# Altium schematic symbol library Regulator_Switching.SchLib: 1120 symbols (part 4 of 8) (continued)
## MAX779L
designator *  value MAX779L  Reference: U
ki_keywords: switching regulator boost step-up dc-dc; ki_description: 210mA, Low voltage input, step-up DC-DC converter, adjustable output voltage, DIP-8/SO-8; ki_fp_filters: SOIC*3.9x4.9mm*P1.27mm* DIP*W7.62mm*; Datasheet: https://kanga.gerbilator.org/ICs/MAX777.pdf
pins: 1 ILIM, 2 IN, 3 AGND, 4 PGND, 5 LX, 6 OUT, 7 ~{{SHDN}}, 8 FB

## MAX1771xSA
designator *  value MAX1771xSA  Reference: U
ki_keywords: Adjustable Step-Up Boost Controller; ki_description: 12V or Adjustable, High-Efficiency, Low IQ, Step-Up DC-DC Controller, SO-8; ki_fp_filters: SO*3.9x4.9mm*P1.27mm*; Footprint: Package_SO:SO-8_3.9x4.9mm_P1.27mm; Datasheet: https://datasheets.maximintegrated.com/en/ds/MAX1771.pdf
pins: 1 EXT, 2 V+, 3 FB, 4 SHDN, 5 REF, 6 AGND, 7 GND, 8 CS

## MAX5035AUPA
designator *  value MAX5035AUPA  Reference: U
ki_keywords: 3.3V 1A Step-Down Converter 76V; ki_description: 1A, High-Efficiency Step-Down DC-DC Converter, 3.3V fixed output voltage, Vin 76V, PDIP-8; ki_fp_filters: DIP*W7.62mm*; Footprint: Package_DIP:DIP-8_W7.62mm; Datasheet: http://datasheets.maximintegrated.com/en/ds/MAX5035.pdf
pins: 1 BST, 2 VD, 3 SGND, 4 FB, 5 ON/~{{OFF}}, 6 GND, 7 VIN, 8 LX

## MAX5035AUSA
designator *  value MAX5035AUSA  Reference: U
ki_keywords: 3.3V 1A Step-Down Converter 76V; ki_description: 1A, High-Efficiency Step-Down DC-DC Converter, 3.3V fixed output voltage, Vin 76V, SO-8; ki_fp_filters: SOIC*3.9x4.9mm*P1.27mm*; Footprint: Package_SO:SOIC-8_3.9x4.9mm_P1.27mm; Datasheet: http://datasheets.maximintegrated.com/en/ds/MAX5035.pdf
pins: 1 BST, 2 VD, 3 SGND, 4 FB, 5 ON/~{{OFF}}, 6 GND, 7 VIN, 8 LX

## MAX5035BUPA
designator *  value MAX5035BUPA  Reference: U
ki_keywords: 5V 1A Step-Down Converter 76V; ki_description: 1A, High-Efficiency Step-Down DC-DC Converter, 5V fixed output voltage, Vin 76V, PDIP-8; ki_fp_filters: DIP*W7.62mm*; Footprint: Package_DIP:DIP-8_W7.62mm; Datasheet: http://datasheets.maximintegrated.com/en/ds/MAX5035.pdf
pins: 1 BST, 2 VD, 3 SGND, 4 FB, 5 ON/~{{OFF}}, 6 GND, 7 VIN, 8 LX

## MAX5035BUSA
designator *  value MAX5035BUSA  Reference: U
ki_keywords: 5V 1A Step-Down Converter 76V; ki_description: 1A, High-Efficiency Step-Down DC-DC Converter, 5V fixed output voltage, Vin 76V, SO-8; ki_fp_filters: SOIC*3.9x4.9mm*P1.27mm*; Footprint: Package_SO:SOIC-8_3.9x4.9mm_P1.27mm; Datasheet: http://datasheets.maximintegrated.com/en/ds/MAX5035.pdf
pins: 1 BST, 2 VD, 3 SGND, 4 FB, 5 ON/~{{OFF}}, 6 GND, 7 VIN, 8 LX

## MAX5035CUPA
designator *  value MAX5035CUPA  Reference: U
ki_keywords: 12V 1A Step-Down Converter 76V; ki_description: 1A, High-Efficiency Step-Down DC-DC Converter, 12V fixed output voltage, Vin 76V, PDIP-8; ki_fp_filters: DIP*W7.62mm*; Footprint: Package_DIP:DIP-8_W7.62mm; Datasheet: http://datasheets.maximintegrated.com/en/ds/MAX5035.pdf
pins: 1 BST, 2 VD, 3 SGND, 4 FB, 5 ON/~{{OFF}}, 6 GND, 7 VIN, 8 LX

## MAX5035CUSA
designator *  value MAX5035CUSA  Reference: U
ki_keywords: 12V 1A Step-Down Converter 76V; ki_description: 1A, High-Efficiency Step-Down DC-DC Converter, 12V fixed output voltage, Vin 76V, SO-8; ki_fp_filters: SOIC*3.9x4.9mm*P1.27mm*; Footprint: Package_SO:SOIC-8_3.9x4.9mm_P1.27mm; Datasheet: http://datasheets.maximintegrated.com/en/ds/MAX5035.pdf
pins: 1 BST, 2 VD, 3 SGND, 4 FB, 5 ON/~{{OFF}}, 6 GND, 7 VIN, 8 LX

## MAX5035DUPA
designator *  value MAX5035DUPA  Reference: U
ki_keywords: Adjustable 1A Step-Down Converter 76V; ki_description: 1A, High-Efficiency Step-Down DC-DC Converter, adjustable output voltage, Vin 76V, PDIP-8; ki_fp_filters: DIP*W7.62mm*; Footprint: Package_DIP:DIP-8_W7.62mm; Datasheet: http://datasheets.maximintegrated.com/en/ds/MAX5035.pdf
pins: 1 BST, 2 VD, 3 SGND, 4 FB, 5 ON/~{{OFF}}, 6 GND, 7 VIN, 8 LX

## MAX5035DUSA
designator *  value MAX5035DUSA  Reference: U
ki_keywords: Adjustable 1A Step-Down Converter 76V; ki_description: 1A, High-Efficiency Step-Down DC-DC Converter, adjustable output voltage, Vin 76V, SO-8; ki_fp_filters: SOIC*3.9x4.9mm*P1.27mm*; Footprint: Package_SO:SOIC-8_3.9x4.9mm_P1.27mm; Datasheet: http://datasheets.maximintegrated.com/en/ds/MAX5035.pdf
pins: 1 BST, 2 VD, 3 SGND, 4 FB, 5 ON/~{{OFF}}, 6 GND, 7 VIN, 8 LX

## MAX5035EUSA
designator *  value MAX5035EUSA  Reference: U
ki_keywords: Adjustable 1A Step-Down Converter 76V; ki_description: 1A, High-Efficiency Step-Down DC-DC Converter, adjustable output voltage, Vin 76V, SO-8; ki_fp_filters: SOIC*3.9x4.9mm*P1.27mm*; Footprint: Package_SO:SOIC-8_3.9x4.9mm_P1.27mm; Datasheet: http://datasheets.maximintegrated.com/en/ds/MAX5035.pdf
pins: 1 BST, 2 VD, 3 SGND, 4 FB, 5 ON/~{{OFF}}, 6 GND, 7 VIN, 8 LX

## MAX15062A
designator *  value MAX15062A  Reference: U
ki_keywords: step-down dc-dc switching regulator; ki_description: 60V, 300mA, synchronous step-down dc-dc converter, 3.3V fixed output voltage, DFN-8; ki_fp_filters: DFN*2x2mm*P0.5mm*; Footprint: Package_DFN_QFN:DFN-8_2x2mm_P0.5mm; Datasheet: http://datasheets.maximintegrated.com/en/ds/MAX15062.pdf
pins: 1 VIN, 2 EN/UVLO, 3 VCC, 4 FB/Vout, 5 MODE, 6 ~{{RESET}}, 7 GND, 8 LX

## MAX15062B
designator *  value MAX15062B  Reference: U
ki_keywords: step-down dc-dc switching regulator; ki_description: 60V, 300mA, synchronous step-down dc-dc converter, 5.0V fixed output voltage, DFN-8; ki_fp_filters: DFN*2x2mm*P0.5mm*; Footprint: Package_DFN_QFN:DFN-8_2x2mm_P0.5mm; Datasheet: http://datasheets.maximintegrated.com/en/ds/MAX15062.pdf
pins: 1 VIN, 2 EN/UVLO, 3 VCC, 4 FB/Vout, 5 MODE, 6 ~{{RESET}}, 7 GND, 8 LX

## MAX15062C
designator *  value MAX15062C  Reference: U
ki_keywords: step-down dc-dc switching regulator; ki_description: 60V, 300mA, synchronous step-down dc-dc converter, adjustable output voltage, DFN-8; ki_fp_filters: DFN*2x2mm*P0.5mm*; Footprint: Package_DFN_QFN:DFN-8_2x2mm_P0.5mm; Datasheet: http://datasheets.maximintegrated.com/en/ds/MAX15062.pdf
pins: 1 VIN, 2 EN/UVLO, 3 VCC, 4 FB/Vout, 5 MODE, 6 ~{{RESET}}, 7 GND, 8 LX

## MAX17501AxTB
designator *  value MAX17501AxTB  Reference: U
ki_keywords: Step-down dc-dc switching regulator; ki_description: 4.5V–60Vin, 500mA, High-Efficiency, 3.3V Synchronous Step-Down DC-DC Converter, PFM Mode, TDFN-10; ki_fp_filters: TDFN*1EP*2x3mm*P0.5mm*; Footprint: Package_DFN_QFN:TDFN-10-1EP_2x3mm_P0.5mm_EP0.9x2mm; Datasheet: https://datasheets.maximintegrated.com/en/ds/MAX17501.pdf
pins: 1 PGND, 2 VIN, 3 EN/UVLO, 4 VCC, 5 FB/VO, 6 SS, 7 NC hidden, 8 ~{{RESET}}, 9 GND, 10 LX, 11 GND hidden

## MAX17501BxTB
designator *  value MAX17501BxTB  Reference: U
ki_keywords: Step-down dc-dc switching regulator; ki_description: 4.5V–60Vin, 500mA, High-Efficiency, 5V Synchronous Step-Down DC-DC Converter, PFM Mode, DFN-10; ki_fp_filters: TDFN*1EP*2x3mm*P0.5mm*; Footprint: Package_DFN_QFN:TDFN-10-1EP_2x3mm_P0.5mm_EP0.9x2mm; Datasheet: https://datasheets.maximintegrated.com/en/ds/MAX17501.pdf
pins: 1 PGND, 2 VIN, 3 EN/UVLO, 4 VCC, 5 FB/VO, 6 SS, 7 NC hidden, 8 ~{{RESET}}, 9 GND, 10 LX, 11 GND hidden

## MAX17501ExTB
designator *  value MAX17501ExTB  Reference: U
ki_keywords: Step-down dc-dc switching regulator; ki_description: 4.5V–60Vin, 500mA, High-Efficiency, 3.3V Synchronous Step-Down DC-DC Converter, PWM Mode, DFN-10; ki_fp_filters: TDFN*1EP*2x3mm*P0.5mm*; Footprint: Package_DFN_QFN:TDFN-10-1EP_2x3mm_P0.5mm_EP0.9x2mm; Datasheet: https://datasheets.maximintegrated.com/en/ds/MAX17501.pdf
pins: 1 PGND, 2 VIN, 3 EN/UVLO, 4 VCC, 5 FB/VO, 6 SS, 7 NC hidden, 8 ~{{RESET}}, 9 GND, 10 LX, 11 GND hidden

## MAX17501FxTB
designator *  value MAX17501FxTB  Reference: U
ki_keywords: Step-down dc-dc switching regulator; ki_description: 4.5V–60Vin, 500mA, High-Efficiency, 5V Synchronous Step-Down DC-DC Converter, PWM Mode, DFN-10; ki_fp_filters: TDFN*1EP*2x3mm*P0.5mm*; Footprint: Package_DFN_QFN:TDFN-10-1EP_2x3mm_P0.5mm_EP0.9x2mm; Datasheet: https://datasheets.maximintegrated.com/en/ds/MAX17501.pdf
pins: 1 PGND, 2 VIN, 3 EN/UVLO, 4 VCC, 5 FB/VO, 6 SS, 7 NC hidden, 8 ~{{RESET}}, 9 GND, 10 LX, 11 GND hidden

## MAX17501GxTB
designator *  value MAX17501GxTB  Reference: U
ki_keywords: Step-down dc-dc switching regulator; ki_description: 4.5V–60Vin, 500mA, High-Efficiency, Adjustable Synchronous Step-Down DC-DC Converter, 600KHz, TDFN-10; ki_fp_filters: TDFN*1EP*2x3mm*P0.5mm*; Footprint: Package_DFN_QFN:TDFN-10-1EP_2x3mm_P0.5mm_EP0.9x2mm; Datasheet: https://datasheets.maximintegrated.com/en/ds/MAX17501.pdf
pins: 1 PGND, 2 VIN, 3 EN/UVLO, 4 VCC, 5 FB/VO, 6 SS, 7 COMP, 8 ~{{RESET}}, 9 GND, 10 LX, 11 GND hidden

## MAX17501HxTB
designator *  value MAX17501HxTB  Reference: U
ki_keywords: Step-down dc-dc switching regulator; ki_description: 4.5V–60Vin, 500mA, High-Efficiency, Adjustable Synchronous Step-Down DC-DC Converter, 300KHz, DFN-10; ki_fp_filters: TDFN*1EP*2x3mm*P0.5mm*; Footprint: Package_DFN_QFN:TDFN-10-1EP_2x3mm_P0.5mm_EP0.9x2mm; Datasheet: https://datasheets.maximintegrated.com/en/ds/MAX17501.pdf
pins: 1 PGND, 2 VIN, 3 EN/UVLO, 4 VCC, 5 FB/VO, 6 SS, 7 COMP, 8 ~{{RESET}}, 9 GND, 10 LX, 11 GND hidden

## MAX17572
designator *  value MAX17572  Reference: U
ki_keywords: Step-down dc-dc switching regulator; ki_description: 4.5V–60V, 1A, High-Efficiency, Synchronous Step-Down DC-DC Converter with Internal Compensation, DFN-12; ki_fp_filters: DFN*1EP*3x3mm*P0.5mm*; Footprint: Package_DFN_QFN:DFN-12-1EP_3x3mm_P0.5mm_EP2.05x2.86mm; Datasheet: https://datasheets.maximintegrated.com/en/ds/MAX17572.pdf
pins: 1 VIN, 2 EN/UVLO, 3 ~{{RESET}}, 4 SS, 5 VCC, 6 RT/SYNC, 7 FB, 8 GND, 9 EXTVCC, 10 BST, 11 LX, 12 PGND, 13 EP

## MAX17574
designator *  value MAX17574  Reference: U
ki_keywords: Step-down dc-dc switching regulator; ki_description: 4.5V–60V, 3A, High-Efficiency, Synchronous Step-Down DC-DC Converter with Internal Compensation, QFN-24; ki_fp_filters: QFN*1EP*4x5mm*P0.5mm*; Footprint: Package_DFN_QFN:QFN-24-1EP_4x5mm_P0.5mm_EP2.65x3.65mm; Datasheet: https://datasheets.maximintegrated.com/en/ds/MAX17574.pdf
pins: 1 LX hidden, 2 PGND, 3 PGND hidden, 4 NC hidden, 5 VIN hidden, 6 VIN hidden, 7 VIN hidden, 8 NC hidden, 9 VIN, 10 EN/UVLO, 11 PGND hidden, 12 VCC, 13 NC hidden, 14 ~{{RESET}}, 15 MODE/SYNC, 16 SS, 17 CF, 18 FB, 19 RT, 20 EXTVCC, 21 SGND, 22 BST, 23 LX hidden, 24 LX, 25 EP

## MAX17620ATA
designator *  value MAX17620ATA  Reference: U
ki_keywords: switching-regulator; ki_description: 2.7-5.5V, 600mA, Synchronous Step-Down DC-DC Converter with Integrated MOSFETs, DFN-8; ki_fp_filters: TDFN*1EP*2x2mm*P0.5mm*; Footprint: Package_DFN_QFN:TDFN-8-1EP_2x2mm_P0.5mm_EP0.8x1.2mm; Datasheet: https://datasheets.maximintegrated.com/en/ds/MAX17620.pdf
pins: 1 IN, 2 GND, 3 EN, 4 MODE, 5 PGOOD, 6 FB, 7 VOUT, 8 LX, 9 GND hidden

## MC33063AD
designator *  value MC33063AD  Reference: U
ki_keywords: smps buck boost inverting; ki_description: 1.5A, step-up/down/inverting switching regulator, 3-40V Vin, 100kHz, SO-8; ki_fp_filters: SOIC*3.9x4.9mm*P1.27mm*; Footprint: Package_SO:SOIC-8_3.9x4.9mm_P1.27mm; Datasheet: http://www.onsemi.com/pub_link/Collateral/MC34063A-D.PDF
pins: 1 SwC, 2 SwE, 3 TC, 4 GND, 5 Vfb, 6 Vin, 7 Ipk, 8 DC

## MC33063AP
designator *  value MC33063AP  Reference: U
ki_keywords: smps buck boost inverting; ki_description: 1.5A, step-up/down/inverting switching regulator, 3-40V Vin, 100kHz, DIP-8; ki_fp_filters: DIP*W7.62mm*; Footprint: Package_DIP:DIP-8_W7.62mm; Datasheet: http://www.onsemi.com/pub_link/Collateral/MC34063A-D.PDF
pins: 1 SwC, 2 SwE, 3 TC, 4 GND, 5 Vfb, 6 Vin, 7 Ipk, 8 DC

## MC33063MNTXG
designator *  value MC33063MNTXG  Reference: U
ki_keywords: smps buck boost inverting; ki_description: 1.5A, step-up/down/inverting switching regulator, 3-40V Vin, 100kHz, DFN-8; ki_fp_filters: DFN*EP*4x4mm*P0.8mm*; Footprint: Package_DFN_QFN:DFN-8-1EP_4x4mm_P0.8mm_EP2.5x3.6mm; Datasheet: http://www.onsemi.com/pub_link/Collateral/MC34063A-D.PDF
pins: 1 SwC, 2 SwE, 3 TC, 4 GND, 5 Vfb, 6 Vin, 7 Ipk, 8 DC, 9 PAD

## MC34063AD
designator *  value MC34063AD  Reference: U
ki_keywords: smps buck boost inverting; ki_description: 1.5A, step-up/down/inverting switching regulator, 3-40V Vin, 100kHz, SO-8; ki_fp_filters: SOIC*3.9x4.9mm*P1.27mm*; Footprint: Package_SO:SOIC-8_3.9x4.9mm_P1.27mm; Datasheet: http://www.onsemi.com/pub_link/Collateral/MC34063A-D.PDF
pins: 1 SwC, 2 SwE, 3 TC, 4 GND, 5 Vfb, 6 Vin, 7 Ipk, 8 DC

## MC34063AP
designator *  value MC34063AP  Reference: U
ki_keywords: smps buck boost inverting; ki_description: 1.5A, step-up/down/inverting switching regulator, 3-40V Vin, 100kHz, DIP-8; ki_fp_filters: DIP*W7.62mm*; Footprint: Package_DIP:DIP-8_W7.62mm; Datasheet: http://www.onsemi.com/pub_link/Collateral/MC34063A-D.PDF
pins: 1 SwC, 2 SwE, 3 TC, 4 GND, 5 Vfb, 6 Vin, 7 Ipk, 8 DC

## MCP1640BCH
designator *  value MCP1640BCH  Reference: U
ki_keywords: Step-Up Boost DC-DC Regulator Adjustable; ki_description: Synchronous Boost Regulator, Adjustable Output 2.0V-5.5V, PWM Only True Disconnect, SOT-23; ki_fp_filters: SOT?23*; Footprint: Package_TO_SOT_SMD:SOT-23-6; Datasheet: http://ww1.microchip.com/downloads/en/DeviceDoc/20002234D.pdf
pins: 1 SW, 2 GND, 3 EN, 4 VFB, 5 VOUT, 6 VIN

## MCP1640BMC
designator *  value MCP1640BMC  Reference: U
ki_keywords: Step-Up Boost DC-DC Regulator Adjustable; ki_description: Synchronous Boost Regulator, Adjustable Output 2.0V-5.5V, PWM Only True Disconnect, DFN-8; ki_fp_filters: DFN*1EP*3x2mm*P0.5mm*; Footprint: Package_DFN_QFN:DFN-8-1EP_3x2mm_P0.5mm_EP1.75x1.45mm; Datasheet: http://ww1.microchip.com/downloads/en/DeviceDoc/20002234D.pdf
pins: 1 VFB, 2 SGND, 3 PGND, 4 EN, 5 SW, 6 VOUTP, 7 VOUTS, 8 VIN, 9 PAD

## MCP1640CCH
designator *  value MCP1640CCH  Reference: U
ki_keywords: Step-Up Boost DC-DC Regulator Adjustable; ki_description: Synchronous Boost Regulator, Adjustable Output 2.0V-5.5V, PWM/PFM Input to Output Bypass, SOT-23; ki_fp_filters: SOT?23*; Footprint: Package_TO_SOT_SMD:SOT-23-6; Datasheet: http://ww1.microchip.com/downloads/en/DeviceDoc/20002234D.pdf
pins: 1 SW, 2 GND, 3 EN, 4 VFB, 5 VOUT, 6 VIN

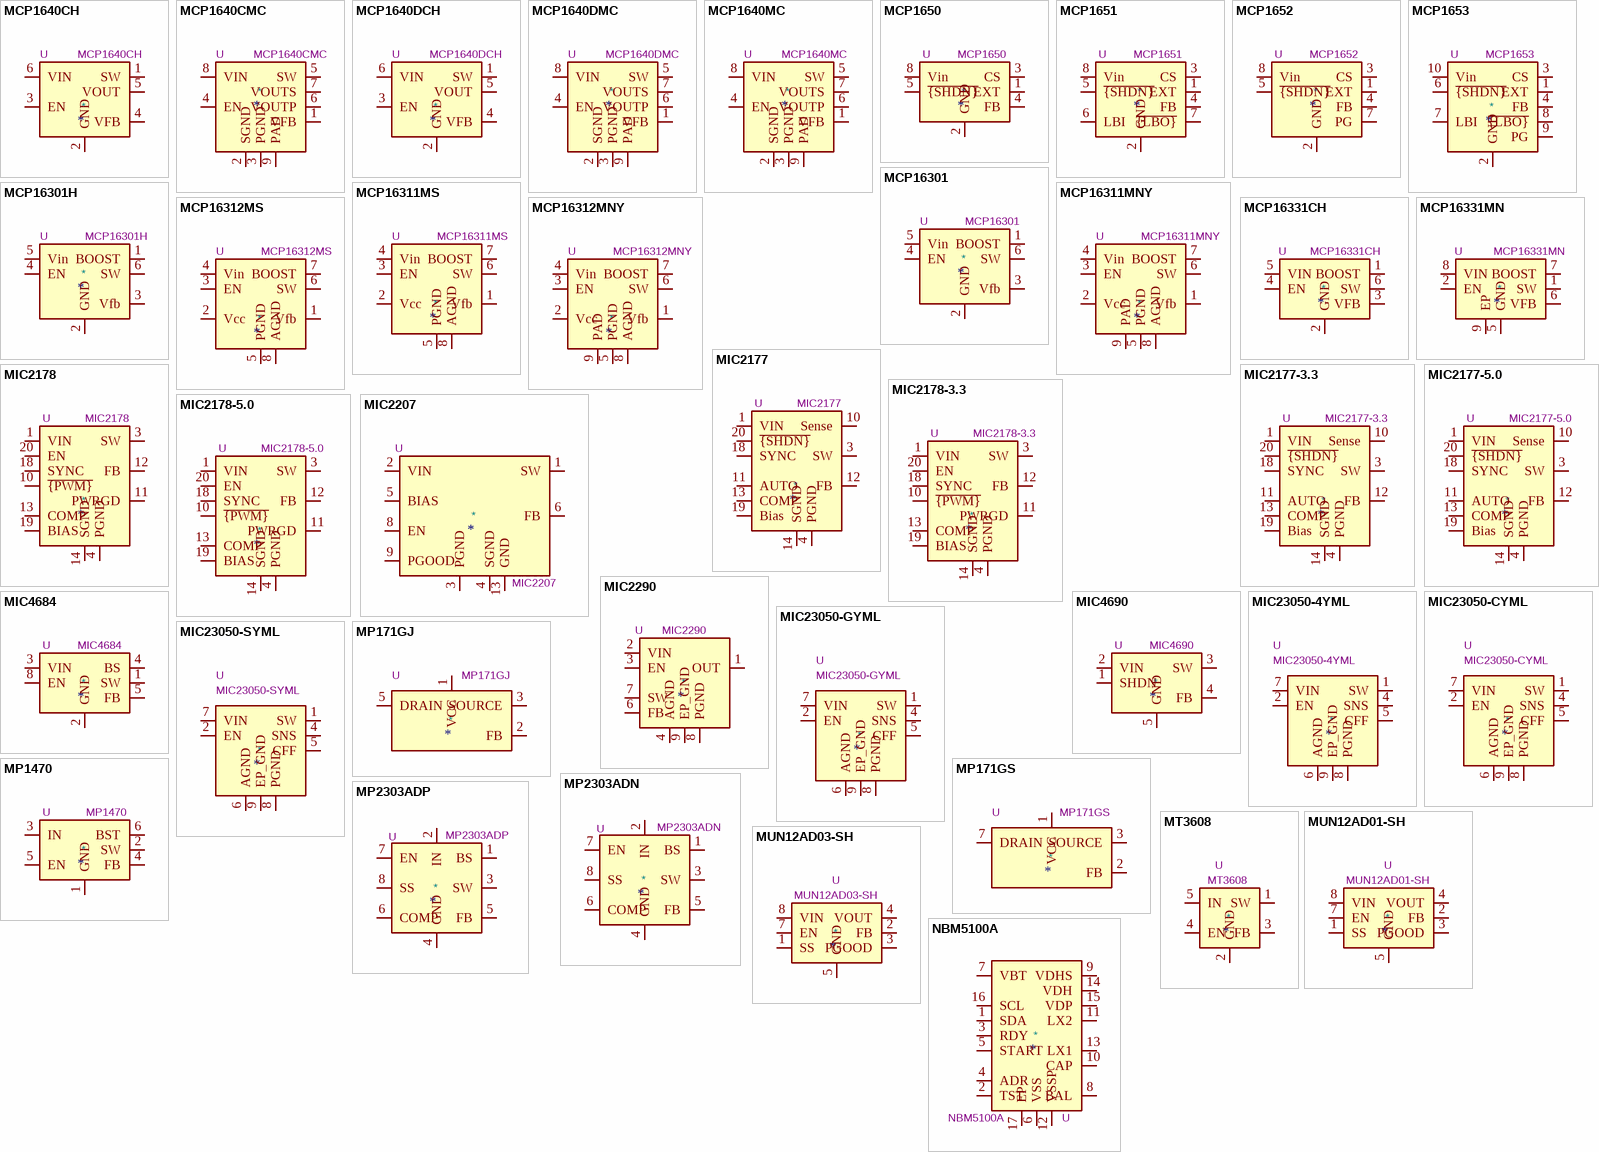
[diagram p14: symbols MCP1640CH to NBM5100A]

## MCP1640CH
designator *  value MCP1640CH  Reference: U
ki_keywords: Step-Up Boost DC-DC Regulator Adjustable; ki_description: Synchronous Boost Regulator, Adjustable Output 2.0V-5.5V, PWM/PFM True Disconnect, SOT-23; ki_fp_filters: SOT?23*; Footprint: Package_TO_SOT_SMD:SOT-23-6; Datasheet: http://ww1.microchip.com/downloads/en/DeviceDoc/20002234D.pdf
pins: 1 SW, 2 GND, 3 EN, 4 VFB, 5 VOUT, 6 VIN

## MCP1640CMC
designator *  value MCP1640CMC  Reference: U
ki_keywords: Step-Up Boost DC-DC Regulator Adjustable; ki_description: Synchronous Boost Regulator, Adjustable Output 2.0V-5.5V, PWM/PFM Input to Output Bypass, DFN-8; ki_fp_filters: DFN*1EP*3x2mm*P0.5mm*; Footprint: Package_DFN_QFN:DFN-8-1EP_3x2mm_P0.5mm_EP1.75x1.45mm; Datasheet: http://ww1.microchip.com/downloads/en/DeviceDoc/20002234D.pdf
pins: 1 VFB, 2 SGND, 3 PGND, 4 EN, 5 SW, 6 VOUTP, 7 VOUTS, 8 VIN, 9 PAD

## MCP1640DCH
designator *  value MCP1640DCH  Reference: U
ki_keywords: Step-Up Boost DC-DC Regulator Adjustable; ki_description: Synchronous Boost Regulator, Adjustable Output 2.0V-5.5V, PWM Only Input to Output Bypass, SOT-23; ki_fp_filters: SOT?23*; Footprint: Package_TO_SOT_SMD:SOT-23-6; Datasheet: http://ww1.microchip.com/downloads/en/DeviceDoc/20002234D.pdf
pins: 1 SW, 2 GND, 3 EN, 4 VFB, 5 VOUT, 6 VIN

## MCP1640DMC
designator *  value MCP1640DMC  Reference: U
ki_keywords: Step-Up Boost DC-DC Regulator Adjustable; ki_description: Synchronous Boost Regulator, Adjustable Output 2.0V-5.5V, PWM Only Input to Output Bypass, DFN-8; ki_fp_filters: DFN*1EP*3x2mm*P0.5mm*; Footprint: Package_DFN_QFN:DFN-8-1EP_3x2mm_P0.5mm_EP1.75x1.45mm; Datasheet: http://ww1.microchip.com/downloads/en/DeviceDoc/20002234D.pdf
pins: 1 VFB, 2 SGND, 3 PGND, 4 EN, 5 SW, 6 VOUTP, 7 VOUTS, 8 VIN, 9 PAD

## MCP1640MC
designator *  value MCP1640MC  Reference: U
ki_keywords: Step-Up Boost DC-DC Regulator Adjustable; ki_description: Synchronous Boost Regulator, Adjustable Output 2.0V-5.5V, PWM/PFM True Disconnect, DFN-8; ki_fp_filters: DFN*1EP*3x2mm*P0.5mm*; Footprint: Package_DFN_QFN:DFN-8-1EP_3x2mm_P0.5mm_EP1.75x1.45mm; Datasheet: http://ww1.microchip.com/downloads/en/DeviceDoc/20002234D.pdf
pins: 1 VFB, 2 SGND, 3 PGND, 4 EN, 5 SW, 6 VOUTP, 7 VOUTS, 8 VIN, 9 PAD

## MCP1650
designator *  value MCP1650  Reference: U
ki_keywords: boost controller; ki_description: 750 kHz Boost Controller, 3.3-100V output voltage, 5W, MSOP-8; ki_fp_filters: MSOP*3x3mm*P0.65mm*; Footprint: Package_SO:MSOP-8_3x3mm_P0.65mm; Datasheet: http://ww1.microchip.com/downloads/en/DeviceDoc/21876B.pdf
pins: 1 EXT, 2 GND, 3 CS, 4 FB, 5 ~{{SHDN}}, 6 NC hidden, 7 NC hidden, 8 Vin

## MCP1651
designator *  value MCP1651  Reference: U
ki_keywords: boost controller; ki_description: 750 kHz Boost Controller, 3.3-100V output voltage, 5W, Low Battery Detection, MSOP-8; ki_fp_filters: MSOP*3x3mm*P0.65mm*; Footprint: Package_SO:MSOP-8_3x3mm_P0.65mm; Datasheet: http://ww1.microchip.com/downloads/en/DeviceDoc/21876B.pdf
pins: 1 EXT, 2 GND, 3 CS, 4 FB, 5 ~{{SHDN}}, 6 LBI, 7 ~{{LBO}}, 8 Vin

## MCP1652
designator *  value MCP1652  Reference: U
ki_keywords: boost controller; ki_description: 750 kHz Boost Controller, 3.3-100V output voltage, 5W, Power Good Detection, MSOP-8; ki_fp_filters: MSOP*3x3mm*P0.65mm*; Footprint: Package_SO:MSOP-8_3x3mm_P0.65mm; Datasheet: http://ww1.microchip.com/downloads/en/DeviceDoc/21876B.pdf
pins: 1 EXT, 2 GND, 3 CS, 4 FB, 5 ~{{SHDN}}, 6 NC hidden, 7 PG, 8 Vin

## MCP1653
designator *  value MCP1653  Reference: U
ki_keywords: boost controller; ki_description: 750 kHz Boost Controller, 3.3-100V output voltage, 5W, Low Battery Detection, Power Good Detection, MSOP-10; ki_fp_filters: MSOP*3x3mm*P0.5mm*; Footprint: Package_SO:MSOP-10_3x3mm_P0.5mm; Datasheet: http://ww1.microchip.com/downloads/en/DeviceDoc/21876B.pdf
pins: 1 EXT, 2 GND, 3 CS, 4 FB, 5 NC hidden, 6 ~{{SHDN}}, 7 LBI, 8 ~{{LBO}}, 9 PG, 10 Vin

## MCP16301
designator *  value MCP16301  Reference: U
ki_keywords: switching buck converter power-supply voltage regulator; ki_description: 1A, 4.0 to 30V Input, High Voltage Input integrated switch step-down regulator, SOT-23-6; ki_fp_filters: SOT?23*; Footprint: Package_TO_SOT_SMD:SOT-23-6; Datasheet: http://ww1.microchip.com/downloads/en/DeviceDoc/20005004D.pdf
pins: 1 BOOST, 2 GND, 3 Vfb, 4 EN, 5 Vin, 6 SW

## MCP16301H
designator *  value MCP16301H  Reference: U
ki_keywords: switching buck converter power-supply voltage regulator; ki_description: 1A, 4.7 to 36V Input, High Voltage Input integrated switch step-down regulator, SOT-23-6; ki_fp_filters: SOT?23*; Footprint: Package_TO_SOT_SMD:SOT-23-6; Datasheet: http://ww1.microchip.com/downloads/en/DeviceDoc/20005004D.pdf
pins: 1 BOOST, 2 GND, 3 Vfb, 4 EN, 5 Vin, 6 SW

## MCP16311MNY
designator *  value MCP16311MNY  Reference: U
ki_keywords: switching buck converter power-supply voltage regulator; ki_description: 1A Output Voltage, 30V Input, integrated switch step-down regulator, PFM/PWM modulation, DFN-8; ki_fp_filters: DFN*1EP*3x2mm*P0.5mm*; Footprint: Package_DFN_QFN:DFN-8-1EP_3x2mm_P0.5mm_EP1.75x1.45mm; Datasheet: http://ww1.microchip.com/downloads/en/DeviceDoc/20005255B.pdf
pins: 1 Vfb, 2 Vcc, 3 EN, 4 Vin, 5 PGND, 6 SW, 7 BOOST, 8 AGND, 9 PAD

## MCP16311MS
designator *  value MCP16311MS  Reference: U
ki_keywords: switching buck converter power-supply voltage regulator; ki_description: 30V Input, 1A Output Voltage, integrated switch step-down regulator, PFM/PWM modulation, MSOP-8; ki_fp_filters: MSOP*3x3mm*P0.65mm*; Footprint: Package_SO:MSOP-8_3x3mm_P0.65mm; Datasheet: http://ww1.microchip.com/downloads/en/DeviceDoc/20005255B.pdf
pins: 1 Vfb, 2 Vcc, 3 EN, 4 Vin, 5 PGND, 6 SW, 7 BOOST, 8 AGND

## MCP16312MNY
designator *  value MCP16312MNY  Reference: U
ki_keywords: switching buck converter power-supply voltage regulator; ki_description: 1A Output Voltage, 30V Input, integrated switch step-down regulator, PWM modulation, DFN-8; ki_fp_filters: DFN*1EP*3x2mm*P0.5mm*; Footprint: Package_DFN_QFN:DFN-8-1EP_3x2mm_P0.5mm_EP1.75x1.45mm; Datasheet: http://ww1.microchip.com/downloads/en/DeviceDoc/20005255B.pdf
pins: 1 Vfb, 2 Vcc, 3 EN, 4 Vin, 5 PGND, 6 SW, 7 BOOST, 8 AGND, 9 PAD

## MCP16312MS
designator *  value MCP16312MS  Reference: U
ki_keywords: switching buck converter power-supply voltage regulator; ki_description: 1A Output Voltage, 30V Input, integrated switch step-down regulator with, modulation, MSOP-8; ki_fp_filters: MSOP*3x3mm*P0.65mm*; Footprint: Package_SO:MSOP-8_3x3mm_P0.65mm; Datasheet: http://ww1.microchip.com/downloads/en/DeviceDoc/20005255B.pdf
pins: 1 Vfb, 2 Vcc, 3 EN, 4 Vin, 5 PGND, 6 SW, 7 BOOST, 8 AGND

## MCP16331CH
designator *  value MCP16331CH  Reference: U
ki_keywords: High-Voltage Input Integrated Switch Step-Down Regulator; ki_description: High-Voltage Input Integrated Switch Step-Down Regulator, VDD +4.4V to 50V, Out +2.0V to +24V, SOT-23; ki_fp_filters: SOT?23*; Footprint: Package_TO_SOT_SMD:SOT-23-6; Datasheet: http://ww1.microchip.com/downloads/en/DeviceDoc/20005308C.pdf
pins: 1 BOOST, 2 GND, 3 VFB, 4 EN, 5 VIN, 6 SW

## MCP16331MN
designator *  value MCP16331MN  Reference: U
ki_keywords: High-Voltage Input Integrated Switch Step-Down Regulator; ki_description: High-Voltage Input Integrated Switch Step-Down Regulator, VDD +4.4V to 50V, Out +2.0V to +24V, TDFN-8; ki_fp_filters: DFN*1EP*3x2mm*P0.5mm*; Footprint: Package_DFN_QFN:DFN-8-1EP_3x2mm_P0.5mm_EP1.75x1.45mm; Datasheet: http://ww1.microchip.com/downloads/en/DeviceDoc/20005308C.pdf
pins: 1 SW, 2 EN, 3 NC hidden, 4 NC hidden, 5 GND, 6 VFB, 7 BOOST, 8 VIN, 9 EP

## MIC2177
designator *  value MIC2177  Reference: U
ki_keywords: Synchronous Buck Regulator adjustable; ki_description: 2.5A Synchronous Buck Regulator, Adjustable Output Voltage, SO-20W; ki_fp_filters: SOIC*W?7.5x12.8mm?P1.27mm*; Footprint: Package_SO:SOIC-20W_7.5x12.8mm_P1.27mm; Datasheet: http://ww1.microchip.com/downloads/en/DeviceDoc/mic2177.pdf
pins: 1 VIN, 2 VIN hidden, 3 SW, 4 PGND, 5 PGND hidden, 6 PGND hidden, 7 PGND hidden, 8 SW hidden, 9 VIN hidden, 10 Sense, 11 AUTO, 12 FB, 13 COMP, 14 SGND, 15 SGND hidden, 16 SGND hidden, 17 SGND hidden, 18 SYNC, 19 Bias, 20 ~{{SHDN}}

## MIC2177-3.3
designator *  value MIC2177-3.3  Reference: U
ki_keywords: Synchronous Buck Regulator fixed; ki_description: 2.5A Synchronous Buck Regulator, 3.3V Fixed Output Voltage, SO-20W; ki_fp_filters: SOIC*W?7.5x12.8mm?P1.27mm*; Footprint: Package_SO:SOIC-20W_7.5x12.8mm_P1.27mm; Datasheet: http://ww1.microchip.com/downloads/en/DeviceDoc/mic2177.pdf
pins: 1 VIN, 2 VIN hidden, 3 SW, 4 PGND, 5 PGND hidden, 6 PGND hidden, 7 PGND hidden, 8 SW hidden, 9 VIN hidden, 10 Sense, 11 AUTO, 12 FB, 13 COMP, 14 SGND, 15 SGND hidden, 16 SGND hidden, 17 SGND hidden, 18 SYNC, 19 Bias, 20 ~{{SHDN}}

## MIC2177-5.0
designator *  value MIC2177-5.0  Reference: U
ki_keywords: Synchronous Buck Regulator fixed; ki_description: 2.5A Synchronous Buck Regulator, 5.0V Fixed Output Voltage, SO-20W; ki_fp_filters: SOIC*W?7.5x12.8mm?P1.27mm*; Footprint: Package_SO:SOIC-20W_7.5x12.8mm_P1.27mm; Datasheet: http://ww1.microchip.com/downloads/en/DeviceDoc/mic2177.pdf
pins: 1 VIN, 2 VIN hidden, 3 SW, 4 PGND, 5 PGND hidden, 6 PGND hidden, 7 PGND hidden, 8 SW hidden, 9 VIN hidden, 10 Sense, 11 AUTO, 12 FB, 13 COMP, 14 SGND, 15 SGND hidden, 16 SGND hidden, 17 SGND hidden, 18 SYNC, 19 Bias, 20 ~{{SHDN}}

## MIC2178
designator *  value MIC2178  Reference: U
ki_keywords: Synchronous Buck Regulator adjustable; ki_description: 2.5A Synchronous Buck Regulator, 4.5-16.5V Input Voltage, Adjustable Output Voltage, SO-20W; ki_fp_filters: SOIC*W*7.5x12.8mm*P1.27mm*; Footprint: Package_SO:SOIC-20W_7.5x12.8mm_P1.27mm; Datasheet: http://ww1.microchip.com/downloads/en/DeviceDoc/mic2177.pdf
pins: 1 VIN, 2 VIN hidden, 3 SW, 4 PGND, 5 PGND hidden, 6 PGND hidden, 7 PGND hidden, 8 SW hidden, 9 VIN hidden, 10 ~{{PWM}}, 11 PWRGD, 12 FB, 13 COMP, 14 SGND, 15 SGND hidden, 16 SGND hidden, 17 SGND hidden, 18 SYNC, 19 BIAS, 20 EN

## MIC2178-3.3
designator *  value MIC2178-3.3  Reference: U
ki_keywords: Synchronous Buck Regulator fixed; ki_description: 2.5A Synchronous Buck Regulator, 4.5-16.5V Input Voltage, 3.3V Fixed Output Voltage, SO-20W; ki_fp_filters: SOIC*W*7.5x12.8mm*P1.27mm*; Footprint: Package_SO:SOIC-20W_7.5x12.8mm_P1.27mm; Datasheet: http://ww1.microchip.com/downloads/en/DeviceDoc/mic2177.pdf
pins: 1 VIN, 2 VIN hidden, 3 SW, 4 PGND, 5 PGND hidden, 6 PGND hidden, 7 PGND hidden, 8 SW hidden, 9 VIN hidden, 10 ~{{PWM}}, 11 PWRGD, 12 FB, 13 COMP, 14 SGND, 15 SGND hidden, 16 SGND hidden, 17 SGND hidden, 18 SYNC, 19 BIAS, 20 EN

## MIC2178-5.0
designator *  value MIC2178-5.0  Reference: U
ki_keywords: Synchronous Buck Regulator fixed; ki_description: 2.5A Synchronous Buck Regulator, 4.5-16.5V Input Voltage, 5.0V Fixed Output Voltage, SO-20W; ki_fp_filters: SOIC*W*7.5x12.8mm*P1.27mm*; Footprint: Package_SO:SOIC-20W_7.5x12.8mm_P1.27mm; Datasheet: http://ww1.microchip.com/downloads/en/DeviceDoc/mic2177.pdf
pins: 1 VIN, 2 VIN hidden, 3 SW, 4 PGND, 5 PGND hidden, 6 PGND hidden, 7 PGND hidden, 8 SW hidden, 9 VIN hidden, 10 ~{{PWM}}, 11 PWRGD, 12 FB, 13 COMP, 14 SGND, 15 SGND hidden, 16 SGND hidden, 17 SGND hidden, 18 SYNC, 19 BIAS, 20 EN

## MIC2207
designator *  value MIC2207  Reference: U
ki_keywords: adjustable switching regulator; ki_description: 3A 2MHz Non-Synchronous Buck Regulator, DFN-12; ki_fp_filters: DFN*1EP*3x3mm*P0.5mm*; Footprint: Package_DFN_QFN:DFN-12-1EP_3x3mm_P0.5mm_EP1.7x2.4mm; Datasheet: https://ww1.microchip.com/downloads/aemDocuments/documents/APID/ProductDocuments/DataSheets/MIC2207-2MHz-3A-PWM-Buck-Regulator-DS20006470A.pdf
pins: 1 SW, 2 VIN, 3 PGND, 4 SGND, 5 BIAS, 6 FB, 7 NC hidden, 8 EN, 9 PGOOD, 10 PGND hidden, 11 VIN hidden, 12 SW hidden, 13 GND

## MIC2290
designator *  value MIC2290  Reference: U
ki_keywords: boost switching voltage converter regulator; ki_description: 1.2 Mhz PWM Boost Regulator with Internal Schotty Diode, MLF-8; ki_fp_filters: Micrel*MLF*8*2x2mm*; Footprint: Package_DFN_QFN:Micrel_MLF-8-1EP_2x2mm_P0.5mm_EP0.8x1.3mm_ThermalVias; Datasheet: http://ww1.microchip.com/downloads/en/DeviceDoc/mic2290.pdf
pins: 1 OUT, 2 VIN, 3 EN, 4 AGND, 5 NC hidden, 6 FB, 7 SW, 8 PGND, 9 EP_GND

## MIC4684
designator *  value MIC4684  Reference: U
ki_keywords: regulator switching adjustable; ki_description: 2A, 200kHz SuperSwitcher Buck Regulator, 4-30V Input Voltage, Adjustable Output Voltage, SO-8; ki_fp_filters: SOIC*3.9x4.9mm*P1.27mm*; Footprint: Package_SO:SOIC-8_3.9x4.9mm_P1.27mm; Datasheet: https://ww1.microchip.com/downloads/en/DeviceDoc/MIC4684.pdf
pins: 1 SW, 2 GND, 3 VIN, 4 BS, 5 FB, 6 GND hidden, 7 GND hidden, 8 EN

## MIC4690
designator *  value MIC4690  Reference: U
ki_keywords: regulator switching adjustable; ki_description: 1A, 500kHz SuperSwitcher Buck Regulator, 4-34V Input Voltage, Adjustable Output Voltage, SO-8; ki_fp_filters: SOIC*3.9x4.9mm*P1.27mm*; Footprint: Package_SO:SOIC-8_3.9x4.9mm_P1.27mm; Datasheet: http://ww1.microchip.com/downloads/en/DeviceDoc/mic4690.pdf
pins: 1 SHDN, 2 VIN, 3 SW, 4 FB, 5 GND, 6 GND hidden, 7 GND hidden, 8 GND hidden

## MIC23050-4YML
designator *  value MIC23050-4YML  Reference: U
ki_keywords: regulator switching; ki_description: 4MHz PWM Buck Regulator with HyperLight Load Switching Scheme, 1.2V Fixed Output Voltage; ki_fp_filters: Micrel*MLF*8*2x2mm*; Footprint: Package_DFN_QFN:Micrel_MLF-8-1EP_2x2mm_P0.5mm_EP0.6x1.2mm_ThermalVias; Datasheet: http://ww1.microchip.com/downloads/en/DeviceDoc/mic23050.pdf
pins: 1 SW, 2 EN, 3 NC hidden, 4 SNS, 5 CFF, 6 AGND, 7 VIN, 8 PGND, 9 EP_GND

## MIC23050-CYML
designator *  value MIC23050-CYML  Reference: U
ki_keywords: regulator switching; ki_description: 4MHz PWM Buck Regulator with HyperLight Load Switching Scheme, 1.0V Fixed Output Voltage, MLF-8; ki_fp_filters: Micrel*MLF*8*2x2mm*; Footprint: Package_DFN_QFN:Micrel_MLF-8-1EP_2x2mm_P0.5mm_EP0.6x1.2mm_ThermalVias; Datasheet: http://ww1.microchip.com/downloads/en/DeviceDoc/mic23050.pdf
pins: 1 SW, 2 EN, 3 NC hidden, 4 SNS, 5 CFF, 6 AGND, 7 VIN, 8 PGND, 9 EP_GND

## MIC23050-GYML
designator *  value MIC23050-GYML  Reference: U
ki_keywords: regulator switching; ki_description: 4MHz PWM Buck Regulator with HyperLight Load Switching Scheme, 1.8V Fixed Output Voltage; ki_fp_filters: Micrel*MLF*8*2x2mm*; Footprint: Package_DFN_QFN:Micrel_MLF-8-1EP_2x2mm_P0.5mm_EP0.6x1.2mm_ThermalVias; Datasheet: http://ww1.microchip.com/downloads/en/DeviceDoc/mic23050.pdf
pins: 1 SW, 2 EN, 3 NC hidden, 4 SNS, 5 CFF, 6 AGND, 7 VIN, 8 PGND, 9 EP_GND

## MIC23050-SYML
designator *  value MIC23050-SYML  Reference: U
ki_keywords: regulator switching; ki_description: 4MHz PWM Buck Regulator with HyperLight Load Switching Scheme, 3.3V Fixed Output Voltage; ki_fp_filters: Micrel*MLF*8*2x2mm*; Footprint: Package_DFN_QFN:Micrel_MLF-8-1EP_2x2mm_P0.5mm_EP0.6x1.2mm_ThermalVias; Datasheet: http://ww1.microchip.com/downloads/en/DeviceDoc/mic23050.pdf
pins: 1 SW, 2 EN, 3 NC hidden, 4 SNS, 5 CFF, 6 AGND, 7 VIN, 8 PGND, 9 EP_GND

## MP171GJ
designator *  value MP171GJ  Reference: U
ki_keywords: regulator switching adjustable; ki_description: 60mA Non-Isolated Off-Line Regulator, 700V Input Voltage, Adjustable Output Voltage, TSOT-23-5; ki_fp_filters: TSOT?23*; Footprint: Package_TO_SOT_SMD:TSOT-23-5; Datasheet: https://www.monolithicpower.com/pub/media/document/m/p/mp171_r1.01.pdf
pins: 1 VCC, 2 FB, 3 SOURCE, 4 SOURCE hidden, 5 DRAIN

## MP171GS
designator *  value MP171GS  Reference: U
ki_keywords: regulator switching adjustable; ki_description: 60mA Non-Isolated Off-Line Regulator, 700V Input Voltage, Adjustable Output Voltage, SOIC-8; ki_fp_filters: SOIC*3.9x4.9mm*P1.27mm*; Footprint: Package_SO:SOIC-8_3.9x4.9mm_P1.27mm; Datasheet: https://www.monolithicpower.com/pub/media/document/m/p/mp171_r1.01.pdf
pins: 1 VCC, 2 FB, 3 SOURCE, 4 SOURCE hidden, 5 NC hidden, 6 NC hidden, 7 DRAIN, 8 NC hidden

## MP1470
designator *  value MP1470  Reference: U
ki_keywords: buck converter; ki_description: High-Efficiency, 2A, 16V, 500kHz Synchronous, Step-Down Converter, TSOT-23-6; ki_fp_filters: TSOT?23*; Footprint: Package_TO_SOT_SMD:TSOT-23-6; Datasheet: https://www.monolithicpower.com/pub/media/document/MP1470_r1.02.pdf
pins: 1 GND, 2 SW, 3 IN, 4 FB, 5 EN, 6 BST

## MP2303ADN
designator *  value MP2303ADN  Reference: U
ki_keywords: buck converter step down; ki_description: Synchronous Rectified 3A, 28V, 360kHz Step-Down Converter, SOIC-8; ki_fp_filters: SOIC*1EP*3.9x4.9mm*P1.27mm*; Footprint: Package_SO:SOIC-8-1EP_3.9x4.9mm_P1.27mm_EP2.62x3.51mm; Datasheet: https://www.monolithicpower.com/pub/media/document/MP2303A_r1.1.pdf
pins: 1 BS, 2 IN, 3 SW, 4 GND, 5 FB, 6 COMP, 7 EN, 8 SS

## MP2303ADP
designator *  value MP2303ADP  Reference: U
ki_keywords: buck converter step down; ki_description: Synchronous Rectified 3A, 28V, 360kHz Step-Down Converter, DIP-8; ki_fp_filters: DIP*W7.62mm*; Footprint: Package_DIP:DIP-8_W7.62mm; Datasheet: https://www.monolithicpower.com/pub/media/document/MP2303A_r1.1.pdf
pins: 1 BS, 2 IN, 3 SW, 4 GND, 5 FB, 6 COMP, 7 EN, 8 SS

## MT3608
designator *  value MT3608  Reference: U
ki_keywords: Step-Up Boost DC-DC Regulator Adjustable; ki_description: High Efficiency 1.2MHz 2A Step Up Converter, 2-24V Vin, 28V Vout, 4A current limit, 1.2MHz, SOT23-6; ki_fp_filters: SOT*23*; Footprint: Package_TO_SOT_SMD:SOT-23-6; Datasheet: https://www.olimex.com/Products/Breadboarding/BB-PWR-3608/resources/MT3608.pdf
pins: 1 SW, 2 GND, 3 FB, 4 EN, 5 IN, 6 NC hidden

## MUN12AD01-SH
designator *  value MUN12AD01-SH  Reference: U
ki_keywords: DC/DC Switching Regulator Power Module 1A Cyntec MUN12AD01; ki_description: DC/DC Switching Regulator, Power Module, 1A, Cyntec MUN12AD01; ki_fp_filters: Converter?DCDC?Cyntec?MUN12AD01?SH*; Footprint: Converter_DCDC:Converter_DCDC_Cyntec_MUN12AD01-SH; Datasheet: http://www.cyntec.com/upfile/products/download/Cyntec%20MUN12AD01-SH_Datasheet.pdf
pins: 1 SS, 2 FB, 3 PGOOD, 4 VOUT, 5 GND, 6 NC hidden, 7 EN, 8 VIN, 9 GND hidden

## MUN12AD03-SH
designator *  value MUN12AD03-SH  Reference: U
ki_keywords: DC/DC Switching Regulator Power Module 3A Cyntec MUN12AD03; ki_description: DC/DC Switching Regulator, Power Module, 3A, Cyntec MUN12AD03; ki_fp_filters: Converter?DCDC?Cyntec?MUN12AD03?SH*; Footprint: Converter_DCDC:Converter_DCDC_Cyntec_MUN12AD03-SH; Datasheet: http://www.cyntec.com/upfile/products/download/Cyntec%20MUN12AD03-SH_Datasheet.pdf
pins: 1 SS, 2 FB, 3 PGOOD, 4 VOUT, 5 GND, 6 NC hidden, 7 EN, 8 VIN, 9 VOUT hidden, 10 GND hidden, 11 GND hidden

## NBM5100A
designator *  value NBM5100A  Reference: U
ki_keywords: charge pump; ki_description: coin cell booster charge pump DHVQFN16 SOT763; ki_fp_filters: DHVQFN*1EP*2.5x3.5mm*P0.5mm*; Footprint: Package_DFN_QFN:DHVQFN-16-1EP_2.5x3.5mm_P0.5mm_EP1x2mm; Datasheet: https://assets.nexperia.com/documents/data-sheet/NBM5100.pdf
pins: 1 SDA, 2 TST, 3 RDY, 4 ADR, 5 START, 6 VSS, 7 VBT, 8 BAL, 9 VDHS, 10 CAP, 11 LX2, 12 VSSP, 13 LX1, 14 VDH, 15 VDP, 16 SCL, 17 EP

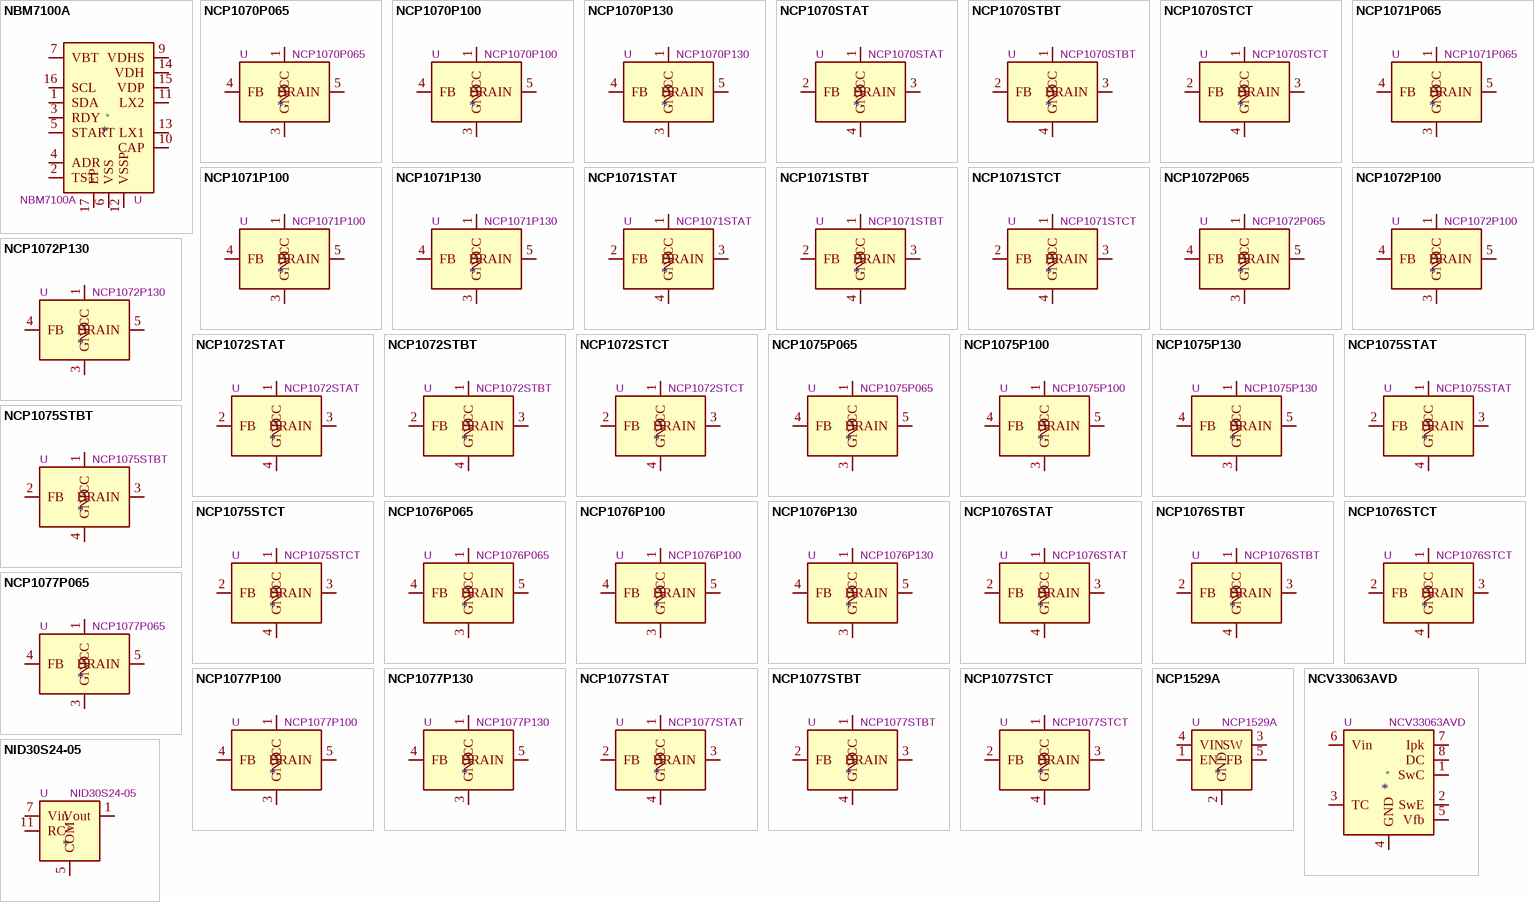
[diagram p15: symbols NBM7100A to NID30S24-05]

## NBM7100A
designator *  value NBM7100A  Reference: U
ki_keywords: charge pump; ki_description: coin cell booster charge pump DHVQFN16 SOT763; ki_fp_filters: DHVQFN*1EP*2.5x3.5mm*P0.5mm*; Footprint: Package_DFN_QFN:DHVQFN-16-1EP_2.5x3.5mm_P0.5mm_EP1x2mm; Datasheet: https://assets.nexperia.com/documents/data-sheet/NBM7100.pdf
pins: 1 SDA, 2 TST, 3 RDY, 4 ADR, 5 START, 6 VSS, 7 VBT, 8 NC hidden, 9 VDHS, 10 CAP, 11 LX2, 12 VSSP, 13 LX1, 14 VDH, 15 VDP, 16 SCL, 17 EP

## NCP1070P065
designator *  value NCP1070P065  Reference: U
ki_keywords: SMPS Converter; ki_description: High-Voltage Switcher for Low Power Offline SMPS, 700V Vds, 14W/7.75W, 230V/85-265V, 65kHz, 22Ohm Rds(on), 250mA Ipk, DIP-7; ki_fp_filters: DIP*N7*W7.62mm*; Footprint: Package_DIP:DIP-8-N7_W7.62mm; Datasheet: http://www.onsemi.com/pub/Collateral/NCP1070-D.PDF
pins: 1 VCC, 2 NC hidden, 3 GND, 4 FB, 5 DRAIN, 7 GND hidden, 8 GND hidden

## NCP1070P100
designator *  value NCP1070P100  Reference: U
ki_keywords: SMPS Converter; ki_description: High-Voltage Switcher for Low Power Offline SMPS, 700V Vds, 14W/7.75W, 230V/85-265V, 100kHz, 22Ohm Rds(on), 250mA Ipk, DIP-7; ki_fp_filters: DIP*N7*W7.62mm*; Footprint: Package_DIP:DIP-8-N7_W7.62mm; Datasheet: http://www.onsemi.com/pub/Collateral/NCP1070-D.PDF
pins: 1 VCC, 2 NC hidden, 3 GND, 4 FB, 5 DRAIN, 7 GND hidden, 8 GND hidden

## NCP1070P130
designator *  value NCP1070P130  Reference: U
ki_keywords: SMPS Converter; ki_description: High-Voltage Switcher for Low Power Offline SMPS, 700V Vds, 14W/7.75W, 230V/85-265V, 130kHz, 22Ohm Rds(on), 250mA Ipk, DIP-7; ki_fp_filters: DIP*N7*W7.62mm*; Footprint: Package_DIP:DIP-8-N7_W7.62mm; Datasheet: http://www.onsemi.com/pub/Collateral/NCP1070-D.PDF
pins: 1 VCC, 2 NC hidden, 3 GND, 4 FB, 5 DRAIN, 7 GND hidden, 8 GND hidden

## NCP1070STAT
designator *  value NCP1070STAT  Reference: U
ki_keywords: SMPS Converter; ki_description: High-Voltage Switcher for Low Power Offline SMPS, 700V Vds, 14W/7.75W, 230V/85-265V, 65kHz, 22Ohm Rds(on), 250mA Ipk, SOT-223; ki_fp_filters: SOT?223*; Footprint: Package_TO_SOT_SMD:SOT-223; Datasheet: http://www.onsemi.com/pub/Collateral/NCP1070-D.PDF
pins: 1 VCC, 2 FB, 3 DRAIN, 4 GND

## NCP1070STBT
designator *  value NCP1070STBT  Reference: U
ki_keywords: SMPS Converter; ki_description: High-Voltage Switcher for Low Power Offline SMPS, 700V Vds, 14W/7.75W, 230V/85-265V, 100kHz, 22Ohm Rds(on), 250mA Ipk, SOT-223; ki_fp_filters: SOT?223*; Footprint: Package_TO_SOT_SMD:SOT-223; Datasheet: http://www.onsemi.com/pub/Collateral/NCP1070-D.PDF
pins: 1 VCC, 2 FB, 3 DRAIN, 4 GND

## NCP1070STCT
designator *  value NCP1070STCT  Reference: U
ki_keywords: SMPS Converter; ki_description: High-Voltage Switcher for Low Power Offline SMPS, 700V Vds, 14W/7.75W, 230V/85-265V, 130kHz, 22Ohm Rds(on), 250mA Ipk, SOT-223; ki_fp_filters: SOT?223*; Footprint: Package_TO_SOT_SMD:SOT-223; Datasheet: http://www.onsemi.com/pub/Collateral/NCP1070-D.PDF
pins: 1 VCC, 2 FB, 3 DRAIN, 4 GND

## NCP1071P065
designator *  value NCP1071P065  Reference: U
ki_keywords: SMPS Converter; ki_description: High-Voltage Switcher for Low Power Offline SMPS, 700V Vds, 14W/7.75W, 230V/85-265V, 65kHz, 22Ohm Rds(on), 350mA Ipk, DIP-7; ki_fp_filters: DIP*N7*W7.62mm*; Footprint: Package_DIP:DIP-8-N7_W7.62mm; Datasheet: http://www.onsemi.com/pub/Collateral/NCP1070-D.PDF
pins: 1 VCC, 2 NC hidden, 3 GND, 4 FB, 5 DRAIN, 7 GND hidden, 8 GND hidden